# Altium footprint library LPC1788.PCBLIB: 33 footprints (part 3 of 3)
Each footprint in its own frame and in the unit in brackets; x right, y up, seen from the top. Pads: shape width x height; smd on the part's side, far side on the other; paste and mask are expansions set on the pad; w line width, h text height; cw(c..) or ccw(c..) is an arc to the next point about the centre after c.
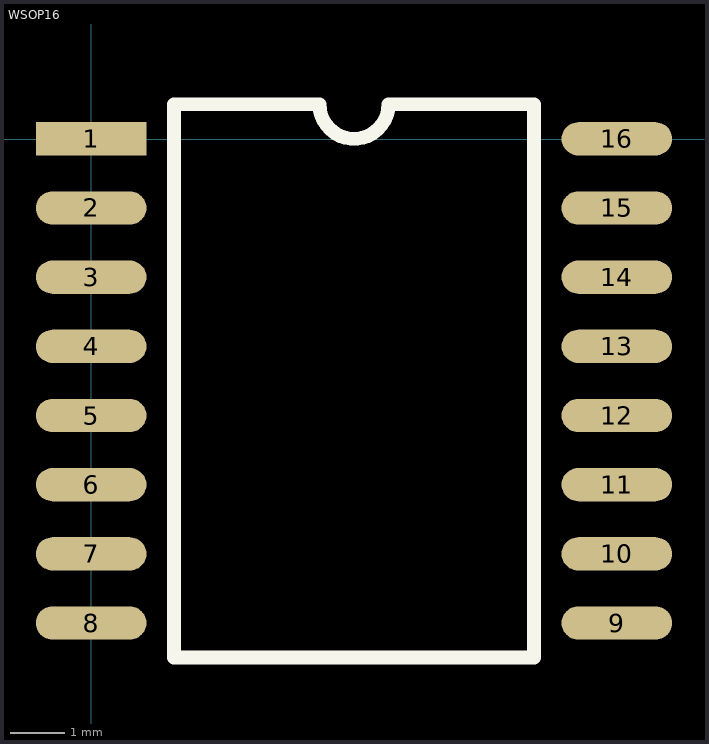
[diagram p2: the footprint, top view; thin cyan lines are the x and y axes]

## WSOP16 [mil]
pads (16):
  rect 80x24 smd: 1(-0.17,0.2)
  oval 80x24 smd: 2(-0.17,-49.8) 3(-0.17,-99.8) 4(-0.17,-149.8) 5(-0.17,-199.8) 6(-0.17,-249.8) 7(-0.17,-299.8) 8(-0.17,-349.8) 9(379.83,-349.8) 10(379.83,-299.8) 11(379.83,-249.8) 12(379.83,-199.8) 13(379.83,-149.8) 14(379.83,-99.8) 15(379.83,-49.8) 16(379.83,0.2)
TopOverlay:
  lines w10: 59.83,-374.8 319.83,-374.8 319.83,25.2 214.83,25.2 cw(c189.83,25.2) 164.83,25.2 59.83,25.2 59.83,-374.8
3D body: height 102.36, standoff 0, extent -23,-376.54 390.39,27